# Altium footprint library CADTchip.PcbLib: 195 footprints (part 3 of 13)
Each footprint in its own frame and in the unit in brackets; x right, y up, seen from the top. Pads: shape width x height; smd on the part's side, far side on the other; paste and mask are expansions set on the pad; w line width, h text height; cw(c..) or ccw(c..) is an arc to the next point about the centre after c.
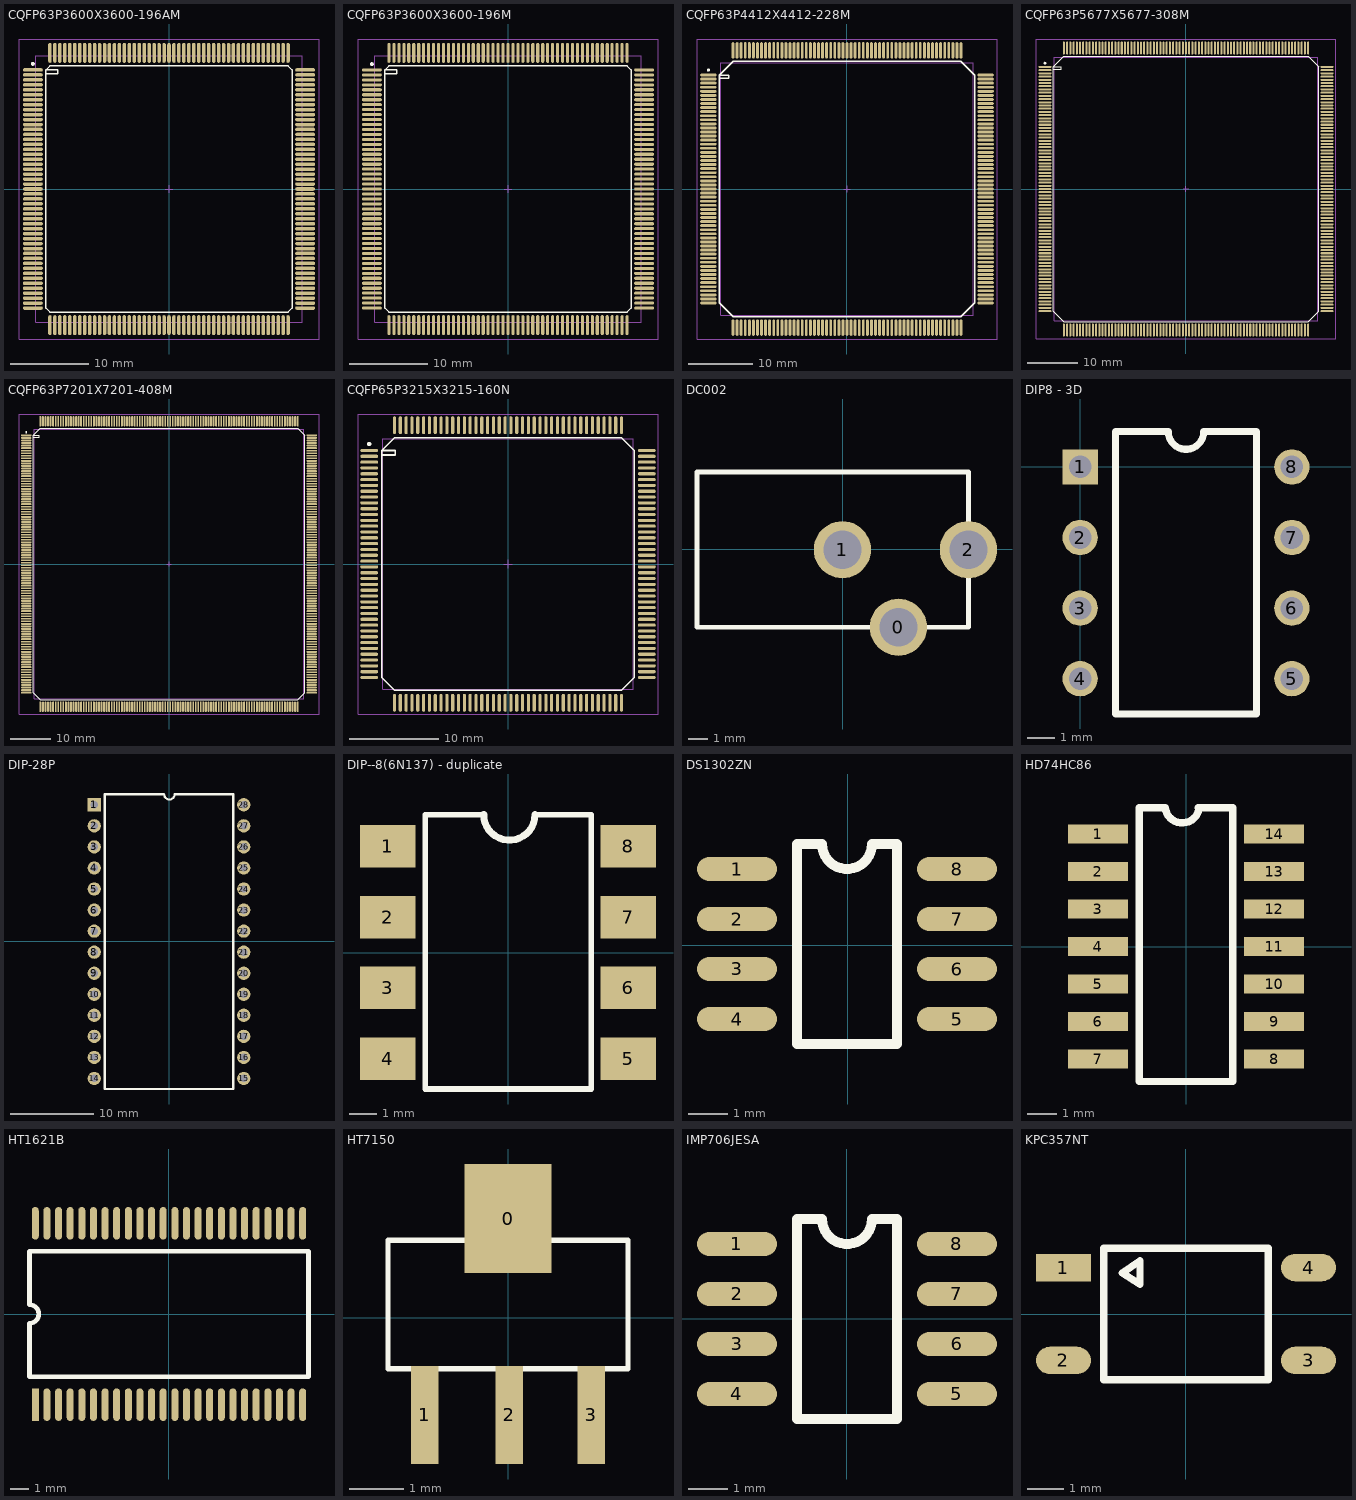
[diagram p2: the footprints below, top view; thin cyan lines are the x and y axes]

## CQFP63P3600X3600-196AM [mm] "196-Pin Ceramic Quad Flat Pack 0.635 mm Pitch"
height 2.7
pads (196):
  oval 2.55x0.45 smd: 1(-17.425,15.24) 2(-17.425,14.605) 3(-17.425,13.97) 4(-17.425,13.335) 5(-17.425,12.7) 6(-17.425,12.065) 7(-17.425,11.43) 8(-17.425,10.795) 9(-17.425,10.16) 10(-17.425,9.525) 11(-17.425,8.89) 12(-17.425,8.255) 13(-17.425,7.62) 14(-17.425,6.985) 15(-17.425,6.35) 16(-17.425,5.715) 17(-17.425,5.08) 18(-17.425,4.445) 19(-17.425,3.81) 20(-17.425,3.175) 21(-17.425,2.54) 22(-17.425,1.905) 23(-17.425,1.27) 24(-17.425,0.635) 25(-17.425,0) 26(-17.425,-0.635) 27(-17.425,-1.27) 28(-17.425,-1.905) 29(-17.425,-2.54) 30(-17.425,-3.175) 31(-17.425,-3.81) 32(-17.425,-4.445) 33(-17.425,-5.08) 34(-17.425,-5.715) 35(-17.425,-6.35) 36(-17.425,-6.985) 37(-17.425,-7.62) 38(-17.425,-8.255) 39(-17.425,-8.89) 40(-17.425,-9.525) 41(-17.425,-10.16) 42(-17.425,-10.795) 43(-17.425,-11.43) 44(-17.425,-12.065) 45(-17.425,-12.7) 46(-17.425,-13.335) 47(-17.425,-13.97) 48(-17.425,-14.605) 49(-17.425,-15.24) 99(17.425,-15.24) 100(17.425,-14.605) 101(17.425,-13.97) 102(17.425,-13.335) 103(17.425,-12.7) 104(17.425,-12.065) 105(17.425,-11.43) 106(17.425,-10.795) 107(17.425,-10.16) 108(17.425,-9.525) 109(17.425,-8.89) 110(17.425,-8.255) 111(17.425,-7.62) 112(17.425,-6.985) 113(17.425,-6.35) 114(17.425,-5.715) 115(17.425,-5.08) 116(17.425,-4.445) 117(17.425,-3.81) 118(17.425,-3.175) 119(17.425,-2.54) 120(17.425,-1.905) 121(17.425,-1.27) 122(17.425,-0.635) 123(17.425,0) 124(17.425,0.635) 125(17.425,1.27) 126(17.425,1.905) 127(17.425,2.54) 128(17.425,3.175) 129(17.425,3.81) 130(17.425,4.445) 131(17.425,5.08) 132(17.425,5.715) 133(17.425,6.35) 134(17.425,6.985) 135(17.425,7.62) 136(17.425,8.255) 137(17.425,8.89) 138(17.425,9.525) 139(17.425,10.16) 140(17.425,10.795) 141(17.425,11.43) 142(17.425,12.065) 143(17.425,12.7) 144(17.425,13.335) 145(17.425,13.97) 146(17.425,14.605) 147(17.425,15.24)
  oval 0.45x2.55 smd: 50(-15.24,-17.425) 51(-14.605,-17.425) 52(-13.97,-17.425) 53(-13.335,-17.425) 54(-12.7,-17.425) 55(-12.065,-17.425) 56(-11.43,-17.425) 57(-10.795,-17.425) 58(-10.16,-17.425) 59(-9.525,-17.425) 60(-8.89,-17.425) 61(-8.255,-17.425) 62(-7.62,-17.425) 63(-6.985,-17.425) 64(-6.35,-17.425) 65(-5.715,-17.425) 66(-5.08,-17.425) 67(-4.445,-17.425) 68(-3.81,-17.425) 69(-3.175,-17.425) 70(-2.54,-17.425) 71(-1.905,-17.425) 72(-1.27,-17.425) 73(-0.635,-17.425) 74(0,-17.425) 75(0.635,-17.425) 76(1.27,-17.425) 77(1.905,-17.425) 78(2.54,-17.425) 79(3.175,-17.425) 80(3.81,-17.425) 81(4.445,-17.425) 82(5.08,-17.425) 83(5.715,-17.425) 84(6.35,-17.425) 85(6.985,-17.425) 86(7.62,-17.425) 87(8.255,-17.425) 88(8.89,-17.425) 89(9.525,-17.425) 90(10.16,-17.425) 91(10.795,-17.425) 92(11.43,-17.425) 93(12.065,-17.425) 94(12.7,-17.425) 95(13.335,-17.425) 96(13.97,-17.425) 97(14.605,-17.425) 98(15.24,-17.425) 148(15.24,17.425) 149(14.605,17.425) 150(13.97,17.425) 151(13.335,17.425) 152(12.7,17.425) 153(12.065,17.425) 154(11.43,17.425) 155(10.795,17.425) 156(10.16,17.425) 157(9.525,17.425) 158(8.89,17.425) 159(8.255,17.425) 160(7.62,17.425) 161(6.985,17.425) 162(6.35,17.425) 163(5.715,17.425) 164(5.08,17.425) 165(4.445,17.425) 166(3.81,17.425) 167(3.175,17.425) 168(2.54,17.425) 169(1.905,17.425) 170(1.27,17.425) 171(0.635,17.425) 172(0,17.425) 173(-0.635,17.425) 174(-1.27,17.425) 175(-1.905,17.425) 176(-2.54,17.425) 177(-3.175,17.425) 178(-3.81,17.425) 179(-4.445,17.425) 180(-5.08,17.425) 181(-5.715,17.425) 182(-6.35,17.425) 183(-6.985,17.425) 184(-7.62,17.425) 185(-8.255,17.425) 186(-8.89,17.425) 187(-9.525,17.425) 188(-10.16,17.425) 189(-10.795,17.425) 190(-11.43,17.425) 191(-12.065,17.425) 192(-12.7,17.425) 193(-13.335,17.425) 194(-13.97,17.425) 195(-14.605,17.425) 196(-15.24,17.425)
Top Overlay:
  circle w0.25: c-17.425,16.015 r0.125
  lines w0.2: -15.75,14.74 -14.25,14.74 -14.25,15.24 -15.75,15.24 ; -15.75,15.24 -15.24,15.75 15.24,15.75 15.75,15.24 15.75,-15.24 15.24,-15.75 -15.24,-15.75 -15.75,-15.24 -15.75,15.24
Mechanical 13:
  lines w0.1: -17.025,-17.025 17.025,-17.025 17.025,17.025 -17.025,17.025 -17.025,-17.025
Mechanical 15:
  lines w0.1: -0.5,0 0.5,0 ; 0,-0.5 0,0.5 ; -19.2,-19.2 19.2,-19.2 19.2,19.2 -19.2,19.2 -19.2,-19.2
3D body: height 2.7, standoff 0, extent -17.025,-17.025 17.025,17.025

## CQFP63P3600X3600-196M [mm] "CQFP, 196-Leads, Body 34x34mm; Pitch 0.635mm, Gullwing Leadform, IPC Low Density"
height 2.7
pads (196):
  oval 2.55x0.4 smd: 1(-17.425,15.24) 2(-17.425,14.605) 3(-17.425,13.97) 4(-17.425,13.335) 5(-17.425,12.7) 6(-17.425,12.065) 7(-17.425,11.43) 8(-17.425,10.795) 9(-17.425,10.16) 10(-17.425,9.525) 11(-17.425,8.89) 12(-17.425,8.255) 13(-17.425,7.62) 14(-17.425,6.985) 15(-17.425,6.35) 16(-17.425,5.715) 17(-17.425,5.08) 18(-17.425,4.445) 19(-17.425,3.81) 20(-17.425,3.175) 21(-17.425,2.54) 22(-17.425,1.905) 23(-17.425,1.27) 24(-17.425,0.635) 25(-17.425,0) 26(-17.425,-0.635) 27(-17.425,-1.27) 28(-17.425,-1.905) 29(-17.425,-2.54) 30(-17.425,-3.175) 31(-17.425,-3.81) 32(-17.425,-4.445) 33(-17.425,-5.08) 34(-17.425,-5.715) 35(-17.425,-6.35) 36(-17.425,-6.985) 37(-17.425,-7.62) 38(-17.425,-8.255) 39(-17.425,-8.89) 40(-17.425,-9.525) 41(-17.425,-10.16) 42(-17.425,-10.795) 43(-17.425,-11.43) 44(-17.425,-12.065) 45(-17.425,-12.7) 46(-17.425,-13.335) 47(-17.425,-13.97) 48(-17.425,-14.605) 49(-17.425,-15.24) 99(17.425,-15.24) 100(17.425,-14.605) 101(17.425,-13.97) 102(17.425,-13.335) 103(17.425,-12.7) 104(17.425,-12.065) 105(17.425,-11.43) 106(17.425,-10.795) 107(17.425,-10.16) 108(17.425,-9.525) 109(17.425,-8.89) 110(17.425,-8.255) 111(17.425,-7.62) 112(17.425,-6.985) 113(17.425,-6.35) 114(17.425,-5.715) 115(17.425,-5.08) 116(17.425,-4.445) 117(17.425,-3.81) 118(17.425,-3.175) 119(17.425,-2.54) 120(17.425,-1.905) 121(17.425,-1.27) 122(17.425,-0.635) 123(17.425,0) 124(17.425,0.635) 125(17.425,1.27) 126(17.425,1.905) 127(17.425,2.54) 128(17.425,3.175) 129(17.425,3.81) 130(17.425,4.445) 131(17.425,5.08) 132(17.425,5.715) 133(17.425,6.35) 134(17.425,6.985) 135(17.425,7.62) 136(17.425,8.255) 137(17.425,8.89) 138(17.425,9.525) 139(17.425,10.16) 140(17.425,10.795) 141(17.425,11.43) 142(17.425,12.065) 143(17.425,12.7) 144(17.425,13.335) 145(17.425,13.97) 146(17.425,14.605) 147(17.425,15.24)
  oval 0.4x2.55 smd: 50(-15.24,-17.425) 51(-14.605,-17.425) 52(-13.97,-17.425) 53(-13.335,-17.425) 54(-12.7,-17.425) 55(-12.065,-17.425) 56(-11.43,-17.425) 57(-10.795,-17.425) 58(-10.16,-17.425) 59(-9.525,-17.425) 60(-8.89,-17.425) 61(-8.255,-17.425) 62(-7.62,-17.425) 63(-6.985,-17.425) 64(-6.35,-17.425) 65(-5.715,-17.425) 66(-5.08,-17.425) 67(-4.445,-17.425) 68(-3.81,-17.425) 69(-3.175,-17.425) 70(-2.54,-17.425) 71(-1.905,-17.425) 72(-1.27,-17.425) 73(-0.635,-17.425) 74(0,-17.425) 75(0.635,-17.425) 76(1.27,-17.425) 77(1.905,-17.425) 78(2.54,-17.425) 79(3.175,-17.425) 80(3.81,-17.425) 81(4.445,-17.425) 82(5.08,-17.425) 83(5.715,-17.425) 84(6.35,-17.425) 85(6.985,-17.425) 86(7.62,-17.425) 87(8.255,-17.425) 88(8.89,-17.425) 89(9.525,-17.425) 90(10.16,-17.425) 91(10.795,-17.425) 92(11.43,-17.425) 93(12.065,-17.425) 94(12.7,-17.425) 95(13.335,-17.425) 96(13.97,-17.425) 97(14.605,-17.425) 98(15.24,-17.425) 148(15.24,17.425) 149(14.605,17.425) 150(13.97,17.425) 151(13.335,17.425) 152(12.7,17.425) 153(12.065,17.425) 154(11.43,17.425) 155(10.795,17.425) 156(10.16,17.425) 157(9.525,17.425) 158(8.89,17.425) 159(8.255,17.425) 160(7.62,17.425) 161(6.985,17.425) 162(6.35,17.425) 163(5.715,17.425) 164(5.08,17.425) 165(4.445,17.425) 166(3.81,17.425) 167(3.175,17.425) 168(2.54,17.425) 169(1.905,17.425) 170(1.27,17.425) 171(0.635,17.425) 172(0,17.425) 173(-0.635,17.425) 174(-1.27,17.425) 175(-1.905,17.425) 176(-2.54,17.425) 177(-3.175,17.425) 178(-3.81,17.425) 179(-4.445,17.425) 180(-5.08,17.425) 181(-5.715,17.425) 182(-6.35,17.425) 183(-6.985,17.425) 184(-7.62,17.425) 185(-8.255,17.425) 186(-8.89,17.425) 187(-9.525,17.425) 188(-10.16,17.425) 189(-10.795,17.425) 190(-11.43,17.425) 191(-12.065,17.425) 192(-12.7,17.425) 193(-13.335,17.425) 194(-13.97,17.425) 195(-14.605,17.425) 196(-15.24,17.425)
Top Overlay:
  circle w0.25: c-17.425,15.99 r0.125
  lines w0.2: -15.75,14.74 -14.25,14.74 -14.25,15.24 -15.75,15.24 ; -15.75,15.24 -15.75,-15.24 -15.24,-15.75 15.24,-15.75 15.75,-15.24 15.75,15.24 15.24,15.75 -15.24,15.75 -15.75,15.24
Mechanical 13:
  lines w0.1: -17.025,-17.025 -17.025,17.025 17.025,17.025 17.025,-17.025 -17.025,-17.025
Mechanical 15:
  lines w0.1: -0.5,0 0.5,0 ; 0,-0.5 0,0.5 ; -19.2,-19.2 -19.2,19.2 19.2,19.2 19.2,-19.2 -19.2,-19.2
3D body: height 2.7, standoff 0, extent -17.025,-17.025 17.025,17.025

## CQFP63P4412X4412-228M [mm] "228-Pin Ceramic Brazed Quad Flat Pack (CB228)"
height 3.4
pads (228):
  oval 2.55x0.45 smd: 1(-21.625,17.78) 2(-21.625,17.145) 3(-21.625,16.51) 4(-21.625,15.875) 5(-21.625,15.24) 6(-21.625,14.605) 7(-21.625,13.97) 8(-21.625,13.335) 9(-21.625,12.7) 10(-21.625,12.065) 11(-21.625,11.43) 12(-21.625,10.795) 13(-21.625,10.16) 14(-21.625,9.525) 15(-21.625,8.89) 16(-21.625,8.255) 17(-21.625,7.62) 18(-21.625,6.985) 19(-21.625,6.35) 20(-21.625,5.715) 21(-21.625,5.08) 22(-21.625,4.445) 23(-21.625,3.81) 24(-21.625,3.175) 25(-21.625,2.54) 26(-21.625,1.905) 27(-21.625,1.27) 28(-21.625,0.635) 29(-21.625,0) 30(-21.625,-0.635) 31(-21.625,-1.27) 32(-21.625,-1.905) 33(-21.625,-2.54) 34(-21.625,-3.175) 35(-21.625,-3.81) 36(-21.625,-4.445) 37(-21.625,-5.08) 38(-21.625,-5.715) 39(-21.625,-6.35) 40(-21.625,-6.985) 41(-21.625,-7.62) 42(-21.625,-8.255) 43(-21.625,-8.89) 44(-21.625,-9.525) 45(-21.625,-10.16) 46(-21.625,-10.795) 47(-21.625,-11.43) 48(-21.625,-12.065) 49(-21.625,-12.7) 50(-21.625,-13.335) 51(-21.625,-13.97) 52(-21.625,-14.605) 53(-21.625,-15.24) 54(-21.625,-15.875) 55(-21.625,-16.51) 56(-21.625,-17.145) 57(-21.625,-17.78) 115(21.625,-17.78) 116(21.625,-17.145) 117(21.625,-16.51) 118(21.625,-15.875) 119(21.625,-15.24) 120(21.625,-14.605) 121(21.625,-13.97) 122(21.625,-13.335) 123(21.625,-12.7) 124(21.625,-12.065) 125(21.625,-11.43) 126(21.625,-10.795) 127(21.625,-10.16) 128(21.625,-9.525) 129(21.625,-8.89) 130(21.625,-8.255) 131(21.625,-7.62) 132(21.625,-6.985) 133(21.625,-6.35) 134(21.625,-5.715) 135(21.625,-5.08) 136(21.625,-4.445) 137(21.625,-3.81) 138(21.625,-3.175) 139(21.625,-2.54) 140(21.625,-1.905) 141(21.625,-1.27) 142(21.625,-0.635) 143(21.625,0) 144(21.625,0.635) 145(21.625,1.27) 146(21.625,1.905) 147(21.625,2.54) 148(21.625,3.175) 149(21.625,3.81) 150(21.625,4.445) 151(21.625,5.08) 152(21.625,5.715) 153(21.625,6.35) 154(21.625,6.985) 155(21.625,7.62) 156(21.625,8.255) 157(21.625,8.89) 158(21.625,9.525) 159(21.625,10.16) 160(21.625,10.795) 161(21.625,11.43) 162(21.625,12.065) 163(21.625,12.7) 164(21.625,13.335) 165(21.625,13.97) 166(21.625,14.605) 167(21.625,15.24) 168(21.625,15.875) 169(21.625,16.51) 170(21.625,17.145) 171(21.625,17.78)
  oval 0.45x2.55 smd: 58(-17.78,-21.625) 59(-17.145,-21.625) 60(-16.51,-21.625) 61(-15.875,-21.625) 62(-15.24,-21.625) 63(-14.605,-21.625) 64(-13.97,-21.625) 65(-13.335,-21.625) 66(-12.7,-21.625) 67(-12.065,-21.625) 68(-11.43,-21.625) 69(-10.795,-21.625) 70(-10.16,-21.625) 71(-9.525,-21.625) 72(-8.89,-21.625) 73(-8.255,-21.625) 74(-7.62,-21.625) 75(-6.985,-21.625) 76(-6.35,-21.625) 77(-5.715,-21.625) 78(-5.08,-21.625) 79(-4.445,-21.625) 80(-3.81,-21.625) 81(-3.175,-21.625) 82(-2.54,-21.625) 83(-1.905,-21.625) 84(-1.27,-21.625) 85(-0.635,-21.625) 86(0,-21.625) 87(0.635,-21.625) 88(1.27,-21.625) 89(1.905,-21.625) 90(2.54,-21.625) 91(3.175,-21.625) 92(3.81,-21.625) 93(4.445,-21.625) 94(5.08,-21.625) 95(5.715,-21.625) 96(6.35,-21.625) 97(6.985,-21.625) 98(7.62,-21.625) 99(8.255,-21.625) 100(8.89,-21.625) 101(9.525,-21.625) 102(10.16,-21.625) 103(10.795,-21.625) 104(11.43,-21.625) 105(12.065,-21.625) 106(12.7,-21.625) 107(13.335,-21.625) 108(13.97,-21.625) 109(14.605,-21.625) 110(15.24,-21.625) 111(15.875,-21.625) 112(16.51,-21.625) 113(17.145,-21.625) 114(17.78,-21.625) 172(17.78,21.625) 173(17.145,21.625) 174(16.51,21.625) 175(15.875,21.625) 176(15.24,21.625) 177(14.605,21.625) 178(13.97,21.625) 179(13.335,21.625) 180(12.7,21.625) 181(12.065,21.625) 182(11.43,21.625) 183(10.795,21.625) 184(10.16,21.625) 185(9.525,21.625) 186(8.89,21.625) 187(8.255,21.625) 188(7.62,21.625) 189(6.985,21.625) 190(6.35,21.625) 191(5.715,21.625) 192(5.08,21.625) 193(4.445,21.625) 194(3.81,21.625) 195(3.175,21.625) 196(2.54,21.625) 197(1.905,21.625) 198(1.27,21.625) 199(0.635,21.625) 200(0,21.625) 201(-0.635,21.625) 202(-1.27,21.625) 203(-1.905,21.625) 204(-2.54,21.625) 205(-3.175,21.625) 206(-3.81,21.625) 207(-4.445,21.625) 208(-5.08,21.625) 209(-5.715,21.625) 210(-6.35,21.625) 211(-6.985,21.625) 212(-7.62,21.625) 213(-8.255,21.625) 214(-8.89,21.625) 215(-9.525,21.625) 216(-10.16,21.625) 217(-10.795,21.625) 218(-11.43,21.625) 219(-12.065,21.625) 220(-12.7,21.625) 221(-13.335,21.625) 222(-13.97,21.625) 223(-14.605,21.625) 224(-15.24,21.625) 225(-15.875,21.625) 226(-16.51,21.625) 227(-17.145,21.625) 228(-17.78,21.625)
Top Overlay:
  circle w0.25: c-21.625,18.555 r0.125
  lines w0.2: -19.95,17.28 -18.45,17.28 -18.45,17.78 -19.95,17.78 ; -19.95,17.78 -17.78,19.95 17.78,19.95 19.95,17.78 19.95,-17.78 17.78,-19.95 -17.78,-19.95 -19.95,-17.78 -19.95,17.78
Mechanical 13:
  lines w0.1: -19.71,-19.71 19.71,-19.71 19.71,19.71 -19.71,19.71 -19.71,-19.71
Mechanical 15:
  lines w0.1: -0.5,0 0.5,0 ; 0,-0.5 0,0.5 ; -23.4,-23.4 23.4,-23.4 23.4,23.4 -23.4,23.4 -23.4,-23.4
3D body: height 3.4, standoff 0, extent -19.71,-19.71 19.71,19.71

## CQFP63P5677X5677-308M [mm] "CQFP, 308-Leads, Body 52x52mm; Pitch 0.635mm, Gullwing Leadform, IPC Low Density"
height 2.6
pads (308):
  oval 2.55x0.4 smd: 1(-27.875,24.13) 2(-27.875,23.495) 3(-27.875,22.86) 4(-27.875,22.225) 5(-27.875,21.59) 6(-27.875,20.955) 7(-27.875,20.32) 8(-27.875,19.685) 9(-27.875,19.05) 10(-27.875,18.415) 11(-27.875,17.78) 12(-27.875,17.145) 13(-27.875,16.51) 14(-27.875,15.875) 15(-27.875,15.24) 16(-27.875,14.605) 17(-27.875,13.97) 18(-27.875,13.335) 19(-27.875,12.7) 20(-27.875,12.065) 21(-27.875,11.43) 22(-27.875,10.795) 23(-27.875,10.16) 24(-27.875,9.525) 25(-27.875,8.89) 26(-27.875,8.255) 27(-27.875,7.62) 28(-27.875,6.985) 29(-27.875,6.35) 30(-27.875,5.715) 31(-27.875,5.08) 32(-27.875,4.445) 33(-27.875,3.81) 34(-27.875,3.175) 35(-27.875,2.54) 36(-27.875,1.905) 37(-27.875,1.27) 38(-27.875,0.635) 39(-27.875,0) 40(-27.875,-0.635) 41(-27.875,-1.27) 42(-27.875,-1.905) 43(-27.875,-2.54) 44(-27.875,-3.175) 45(-27.875,-3.81) 46(-27.875,-4.445) 47(-27.875,-5.08) 48(-27.875,-5.715) 49(-27.875,-6.35) 50(-27.875,-6.985) 51(-27.875,-7.62) 52(-27.875,-8.255) 53(-27.875,-8.89) 54(-27.875,-9.525) 55(-27.875,-10.16) 56(-27.875,-10.795) 57(-27.875,-11.43) 58(-27.875,-12.065) 59(-27.875,-12.7) 60(-27.875,-13.335) 61(-27.875,-13.97) 62(-27.875,-14.605) 63(-27.875,-15.24) 64(-27.875,-15.875) 65(-27.875,-16.51) 66(-27.875,-17.145) 67(-27.875,-17.78) 68(-27.875,-18.415) 69(-27.875,-19.05) 70(-27.875,-19.685) 71(-27.875,-20.32) 72(-27.875,-20.955) 73(-27.875,-21.59) 74(-27.875,-22.225) 75(-27.875,-22.86) 76(-27.875,-23.495) 77(-27.875,-24.13) 155(27.875,-24.13) 156(27.875,-23.495) 157(27.875,-22.86) 158(27.875,-22.225) 159(27.875,-21.59) 160(27.875,-20.955) 161(27.875,-20.32) 162(27.875,-19.685) 163(27.875,-19.05) 164(27.875,-18.415) 165(27.875,-17.78) 166(27.875,-17.145) 167(27.875,-16.51) 168(27.875,-15.875) 169(27.875,-15.24) 170(27.875,-14.605) 171(27.875,-13.97) 172(27.875,-13.335) 173(27.875,-12.7) 174(27.875,-12.065) 175(27.875,-11.43) 176(27.875,-10.795) 177(27.875,-10.16) 178(27.875,-9.525) 179(27.875,-8.89) 180(27.875,-8.255) 181(27.875,-7.62) 182(27.875,-6.985) 183(27.875,-6.35) 184(27.875,-5.715) 185(27.875,-5.08) 186(27.875,-4.445) 187(27.875,-3.81) 188(27.875,-3.175) 189(27.875,-2.54) 190(27.875,-1.905) 191(27.875,-1.27) 192(27.875,-0.635) 193(27.875,0) 194(27.875,0.635) 195(27.875,1.27) 196(27.875,1.905) 197(27.875,2.54) 198(27.875,3.175) 199(27.875,3.81) 200(27.875,4.445) 201(27.875,5.08) 202(27.875,5.715) 203(27.875,6.35) 204(27.875,6.985) 205(27.875,7.62) 206(27.875,8.255) 207(27.875,8.89) 208(27.875,9.525) 209(27.875,10.16) 210(27.875,10.795) 211(27.875,11.43) 212(27.875,12.065) 213(27.875,12.7) 214(27.875,13.335) 215(27.875,13.97) 216(27.875,14.605) 217(27.875,15.24) 218(27.875,15.875) 219(27.875,16.51) 220(27.875,17.145) 221(27.875,17.78) 222(27.875,18.415) 223(27.875,19.05) 224(27.875,19.685) 225(27.875,20.32) 226(27.875,20.955) 227(27.875,21.59) 228(27.875,22.225) 229(27.875,22.86) 230(27.875,23.495) 231(27.875,24.13)
  oval 0.4x2.55 smd: 78(-24.13,-27.875) 79(-23.495,-27.875) 80(-22.86,-27.875) 81(-22.225,-27.875) 82(-21.59,-27.875) 83(-20.955,-27.875) 84(-20.32,-27.875) 85(-19.685,-27.875) 86(-19.05,-27.875) 87(-18.415,-27.875) 88(-17.78,-27.875) 89(-17.145,-27.875) 90(-16.51,-27.875) 91(-15.875,-27.875) 92(-15.24,-27.875) 93(-14.605,-27.875) 94(-13.97,-27.875) 95(-13.335,-27.875) 96(-12.7,-27.875) 97(-12.065,-27.875) 98(-11.43,-27.875) 99(-10.795,-27.875) 100(-10.16,-27.875) 101(-9.525,-27.875) 102(-8.89,-27.875) 103(-8.255,-27.875) 104(-7.62,-27.875) 105(-6.985,-27.875) 106(-6.35,-27.875) 107(-5.715,-27.875) 108(-5.08,-27.875) 109(-4.445,-27.875) 110(-3.81,-27.875) 111(-3.175,-27.875) 112(-2.54,-27.875) 113(-1.905,-27.875) 114(-1.27,-27.875) 115(-0.635,-27.875) 116(0,-27.875) 117(0.635,-27.875) 118(1.27,-27.875) 119(1.905,-27.875) 120(2.54,-27.875) 121(3.175,-27.875) 122(3.81,-27.875) 123(4.445,-27.875) 124(5.08,-27.875) 125(5.715,-27.875) 126(6.35,-27.875) 127(6.985,-27.875) 128(7.62,-27.875) 129(8.255,-27.875) 130(8.89,-27.875) 131(9.525,-27.875) 132(10.16,-27.875) 133(10.795,-27.875) 134(11.43,-27.875) 135(12.065,-27.875) 136(12.7,-27.875) 137(13.335,-27.875) 138(13.97,-27.875) 139(14.605,-27.875) 140(15.24,-27.875) 141(15.875,-27.875) 142(16.51,-27.875) 143(17.145,-27.875) 144(17.78,-27.875) 145(18.415,-27.875) 146(19.05,-27.875) 147(19.685,-27.875) 148(20.32,-27.875) 149(20.955,-27.875) 150(21.59,-27.875) 151(22.225,-27.875) 152(22.86,-27.875) 153(23.495,-27.875) 154(24.13,-27.875) 232(24.13,27.875) 233(23.495,27.875) 234(22.86,27.875) 235(22.225,27.875) 236(21.59,27.875) 237(20.955,27.875) 238(20.32,27.875) 239(19.685,27.875) 240(19.05,27.875) 241(18.415,27.875) 242(17.78,27.875) 243(17.145,27.875) 244(16.51,27.875) 245(15.875,27.875) 246(15.24,27.875) 247(14.605,27.875) 248(13.97,27.875) 249(13.335,27.875) 250(12.7,27.875) 251(12.065,27.875) 252(11.43,27.875) 253(10.795,27.875) 254(10.16,27.875) 255(9.525,27.875) 256(8.89,27.875) 257(8.255,27.875) 258(7.62,27.875) 259(6.985,27.875) 260(6.35,27.875) 261(5.715,27.875) 262(5.08,27.875) 263(4.445,27.875) 264(3.81,27.875) 265(3.175,27.875) 266(2.54,27.875) 267(1.905,27.875) 268(1.27,27.875) 269(0.635,27.875) 270(0,27.875) 271(-0.635,27.875) 272(-1.27,27.875) 273(-1.905,27.875) 274(-2.54,27.875) 275(-3.175,27.875) 276(-3.81,27.875) 277(-4.445,27.875) 278(-5.08,27.875) 279(-5.715,27.875) 280(-6.35,27.875) 281(-6.985,27.875) 282(-7.62,27.875) 283(-8.255,27.875) 284(-8.89,27.875) 285(-9.525,27.875) 286(-10.16,27.875) 287(-10.795,27.875) 288(-11.43,27.875) 289(-12.065,27.875) 290(-12.7,27.875) 291(-13.335,27.875) 292(-13.97,27.875) 293(-14.605,27.875) 294(-15.24,27.875) 295(-15.875,27.875) 296(-16.51,27.875) 297(-17.145,27.875) 298(-17.78,27.875) 299(-18.415,27.875) 300(-19.05,27.875) 301(-19.685,27.875) 302(-20.32,27.875) 303(-20.955,27.875) 304(-21.59,27.875) 305(-22.225,27.875) 306(-22.86,27.875) 307(-23.495,27.875) 308(-24.13,27.875)
Top Overlay:
  circle w0.25: c-27.875,24.88 r0.125
  lines w0.2: -26.2,23.63 -24.7,23.63 -24.7,24.13 -26.2,24.13 ; -26.2,24.13 -26.2,-24.13 -24.13,-26.2 24.13,-26.2 26.2,-24.13 26.2,24.13 24.13,26.2 -24.13,26.2 -26.2,24.13
Mechanical 13:
  lines w0.1: -26.035,-26.035 -26.035,26.035 26.035,26.035 26.035,-26.035 -26.035,-26.035
Mechanical 15:
  lines w0.1: -0.5,0 0.5,0 ; 0,-0.5 0,0.5 ; -29.65,-29.65 -29.65,29.65 29.65,29.65 29.65,-29.65 -29.65,-29.65
3D body: height 2.6, standoff 0, extent -26.035,-26.035 26.035,26.035

## CQFP63P7201X7201-408M [mm] "408-Pin Ceramic Quad Flat Pack 0.635 mm Pitch"
height 2.5
pads (408):
  oval 2.6x0.45 smd: 1(-35.6,32.067) 2(-35.6,31.432) 3(-35.6,30.797) 4(-35.6,30.162) 5(-35.6,29.527) 6(-35.6,28.892) 7(-35.6,28.258) 8(-35.6,27.622) 9(-35.6,26.987) 10(-35.6,26.352) 11(-35.6,25.717) 12(-35.6,25.082) 13(-35.6,24.447) 14(-35.6,23.812) 15(-35.6,23.177) 16(-35.6,22.543) 17(-35.6,21.907) 18(-35.6,21.273) 19(-35.6,20.637) 20(-35.6,20.002) 21(-35.6,19.367) 22(-35.6,18.732) 23(-35.6,18.098) 24(-35.6,17.462) 25(-35.6,16.828) 26(-35.6,16.192) 27(-35.6,15.557) 28(-35.6,14.922) 29(-35.6,14.287) 30(-35.6,13.652) 31(-35.6,13.018) 32(-35.6,12.383) 33(-35.6,11.747) 34(-35.6,11.112) 35(-35.6,10.477) 36(-35.6,9.842) 37(-35.6,9.207) 38(-35.6,8.572) 39(-35.6,7.938) 40(-35.6,7.302) 41(-35.6,6.667) 42(-35.6,6.032) 43(-35.6,5.397) 44(-35.6,4.763) 45(-35.6,4.127) 46(-35.6,3.492) 47(-35.6,2.857) 48(-35.6,2.222) 49(-35.6,1.587) 50(-35.6,0.953) 51(-35.6,0.318) 52(-35.6,-0.318) 53(-35.6,-0.953) 54(-35.6,-1.587) 55(-35.6,-2.222) 56(-35.6,-2.857) 57(-35.6,-3.492) 58(-35.6,-4.127) 59(-35.6,-4.763) 60(-35.6,-5.397) 61(-35.6,-6.032) 62(-35.6,-6.667) 63(-35.6,-7.302) 64(-35.6,-7.938) 65(-35.6,-8.572) 66(-35.6,-9.207) 67(-35.6,-9.842) 68(-35.6,-10.477) 69(-35.6,-11.112) 70(-35.6,-11.747) 71(-35.6,-12.383) 72(-35.6,-13.018) 73(-35.6,-13.652) 74(-35.6,-14.287) 75(-35.6,-14.922) 76(-35.6,-15.557) 77(-35.6,-16.192) 78(-35.6,-16.828) 79(-35.6,-17.462) 80(-35.6,-18.098) 81(-35.6,-18.732) 82(-35.6,-19.367) 83(-35.6,-20.002) 84(-35.6,-20.637) 85(-35.6,-21.273) 86(-35.6,-21.907) 87(-35.6,-22.543) 88(-35.6,-23.177) 89(-35.6,-23.812) 90(-35.6,-24.447) 91(-35.6,-25.082) 92(-35.6,-25.717) 93(-35.6,-26.352) 94(-35.6,-26.987) 95(-35.6,-27.622) 96(-35.6,-28.258) 97(-35.6,-28.892) 98(-35.6,-29.527) 99(-35.6,-30.162) 100(-35.6,-30.797) 101(-35.6,-31.432) 102(-35.6,-32.067) 205(35.6,-32.067) 206(35.6,-31.432) 207(35.6,-30.797) 208(35.6,-30.162) 209(35.6,-29.527) 210(35.6,-28.892) 211(35.6,-28.258) 212(35.6,-27.622) 213(35.6,-26.987) 214(35.6,-26.352) 215(35.6,-25.717) 216(35.6,-25.082) 217(35.6,-24.447) 218(35.6,-23.812) 219(35.6,-23.177) 220(35.6,-22.543) 221(35.6,-21.907) 222(35.6,-21.273) 223(35.6,-20.637) 224(35.6,-20.002) 225(35.6,-19.367) 226(35.6,-18.732) 227(35.6,-18.098) 228(35.6,-17.462) 229(35.6,-16.828) 230(35.6,-16.192) 231(35.6,-15.557) 232(35.6,-14.922) 233(35.6,-14.287) 234(35.6,-13.652) 235(35.6,-13.018) 236(35.6,-12.383) 237(35.6,-11.747) 238(35.6,-11.112) 239(35.6,-10.477) 240(35.6,-9.842) 241(35.6,-9.207) 242(35.6,-8.572) 243(35.6,-7.938) 244(35.6,-7.302) 245(35.6,-6.667) 246(35.6,-6.032) 247(35.6,-5.397) 248(35.6,-4.763) 249(35.6,-4.127) 250(35.6,-3.492) 251(35.6,-2.857) 252(35.6,-2.222) 253(35.6,-1.587) 254(35.6,-0.953) 255(35.6,-0.318) 256(35.6,0.318) 257(35.6,0.953) 258(35.6,1.587) 259(35.6,2.222) 260(35.6,2.857) 261(35.6,3.492) 262(35.6,4.127) 263(35.6,4.763) 264(35.6,5.397) 265(35.6,6.032) 266(35.6,6.667) 267(35.6,7.302) 268(35.6,7.938) 269(35.6,8.572) 270(35.6,9.207) 271(35.6,9.842) 272(35.6,10.477) 273(35.6,11.112) 274(35.6,11.747) 275(35.6,12.383) 276(35.6,13.018) 277(35.6,13.652) 278(35.6,14.287) 279(35.6,14.922) 280(35.6,15.557) 281(35.6,16.192) 282(35.6,16.828) 283(35.6,17.462) 284(35.6,18.098) 285(35.6,18.732) 286(35.6,19.367) 287(35.6,20.002) 288(35.6,20.637) 289(35.6,21.273) 290(35.6,21.907) 291(35.6,22.543) 292(35.6,23.177) 293(35.6,23.812) 294(35.6,24.447) 295(35.6,25.082) 296(35.6,25.717) 297(35.6,26.352) 298(35.6,26.987) 299(35.6,27.622) 300(35.6,28.258) 301(35.6,28.892) 302(35.6,29.527) 303(35.6,30.162) 304(35.6,30.797) 305(35.6,31.432) 306(35.6,32.067)
  oval 0.45x2.6 smd: 103(-32.067,-35.6) 104(-31.432,-35.6) 105(-30.797,-35.6) 106(-30.162,-35.6) 107(-29.527,-35.6) 108(-28.892,-35.6) 109(-28.258,-35.6) 110(-27.622,-35.6) 111(-26.987,-35.6) 112(-26.352,-35.6) 113(-25.717,-35.6) 114(-25.082,-35.6) 115(-24.447,-35.6) 116(-23.812,-35.6) 117(-23.177,-35.6) 118(-22.543,-35.6) 119(-21.907,-35.6) 120(-21.273,-35.6) 121(-20.637,-35.6) 122(-20.002,-35.6) 123(-19.367,-35.6) 124(-18.732,-35.6) 125(-18.098,-35.6) 126(-17.462,-35.6) 127(-16.828,-35.6) 128(-16.192,-35.6) 129(-15.557,-35.6) 130(-14.922,-35.6) 131(-14.287,-35.6) 132(-13.652,-35.6) 133(-13.018,-35.6) 134(-12.383,-35.6) 135(-11.747,-35.6) 136(-11.112,-35.6) 137(-10.477,-35.6) 138(-9.842,-35.6) 139(-9.207,-35.6) 140(-8.572,-35.6) 141(-7.938,-35.6) 142(-7.302,-35.6) 143(-6.667,-35.6) 144(-6.032,-35.6) 145(-5.397,-35.6) 146(-4.763,-35.6) 147(-4.127,-35.6) 148(-3.492,-35.6) 149(-2.857,-35.6) 150(-2.222,-35.6) 151(-1.587,-35.6) 152(-0.953,-35.6) 153(-0.318,-35.6) 154(0.318,-35.6) 155(0.953,-35.6) 156(1.587,-35.6) 157(2.222,-35.6) 158(2.857,-35.6) 159(3.492,-35.6) 160(4.127,-35.6) 161(4.763,-35.6) 162(5.397,-35.6) 163(6.032,-35.6) 164(6.667,-35.6) 165(7.302,-35.6) 166(7.938,-35.6) 167(8.572,-35.6) 168(9.207,-35.6) 169(9.842,-35.6) 170(10.477,-35.6) 171(11.112,-35.6) 172(11.747,-35.6) 173(12.383,-35.6) 174(13.018,-35.6) 175(13.652,-35.6) 176(14.287,-35.6) 177(14.922,-35.6) 178(15.557,-35.6) 179(16.192,-35.6) 180(16.828,-35.6) 181(17.462,-35.6) 182(18.098,-35.6) 183(18.732,-35.6) 184(19.367,-35.6) 185(20.002,-35.6) 186(20.637,-35.6) 187(21.273,-35.6) 188(21.907,-35.6) 189(22.543,-35.6) 190(23.177,-35.6) 191(23.812,-35.6) 192(24.447,-35.6) 193(25.082,-35.6) 194(25.717,-35.6) 195(26.352,-35.6) 196(26.987,-35.6) 197(27.622,-35.6) 198(28.258,-35.6) 199(28.892,-35.6) 200(29.527,-35.6) 201(30.162,-35.6) 202(30.797,-35.6) 203(31.432,-35.6) 204(32.067,-35.6) 307(32.067,35.6) 308(31.432,35.6) 309(30.797,35.6) 310(30.162,35.6) 311(29.527,35.6) 312(28.892,35.6) 313(28.258,35.6) 314(27.622,35.6) 315(26.987,35.6) 316(26.352,35.6) 317(25.717,35.6) 318(25.082,35.6) 319(24.447,35.6) 320(23.812,35.6) 321(23.177,35.6) 322(22.543,35.6) 323(21.907,35.6) 324(21.273,35.6) 325(20.637,35.6) 326(20.002,35.6) 327(19.367,35.6) 328(18.732,35.6) 329(18.098,35.6) 330(17.462,35.6) 331(16.828,35.6) 332(16.192,35.6) 333(15.557,35.6) 334(14.922,35.6) 335(14.287,35.6) 336(13.652,35.6) 337(13.018,35.6) 338(12.383,35.6) 339(11.747,35.6) 340(11.112,35.6) 341(10.477,35.6) 342(9.842,35.6) 343(9.207,35.6) 344(8.572,35.6) 345(7.938,35.6) 346(7.302,35.6) 347(6.667,35.6) 348(6.032,35.6) 349(5.397,35.6) 350(4.763,35.6) 351(4.127,35.6) 352(3.492,35.6) 353(2.857,35.6) 354(2.222,35.6) 355(1.587,35.6) 356(0.953,35.6) 357(0.318,35.6) 358(-0.318,35.6) 359(-0.953,35.6) 360(-1.587,35.6) 361(-2.222,35.6) 362(-2.857,35.6) 363(-3.492,35.6) 364(-4.127,35.6) 365(-4.763,35.6) 366(-5.397,35.6) 367(-6.032,35.6) 368(-6.667,35.6) 369(-7.302,35.6) 370(-7.938,35.6) 371(-8.572,35.6) 372(-9.207,35.6) 373(-9.842,35.6) 374(-10.477,35.6) 375(-11.112,35.6) 376(-11.747,35.6) 377(-12.383,35.6) 378(-13.018,35.6) 379(-13.652,35.6) 380(-14.287,35.6) 381(-14.922,35.6) 382(-15.557,35.6) 383(-16.192,35.6) 384(-16.828,35.6) 385(-17.462,35.6) 386(-18.098,35.6) 387(-18.732,35.6) 388(-19.367,35.6) 389(-20.002,35.6) 390(-20.637,35.6) 391(-21.273,35.6) 392(-21.907,35.6) 393(-22.543,35.6) 394(-23.177,35.6) 395(-23.812,35.6) 396(-24.447,35.6) 397(-25.082,35.6) 398(-25.717,35.6) 399(-26.352,35.6) 400(-26.987,35.6) 401(-27.622,35.6) 402(-28.258,35.6) 403(-28.892,35.6) 404(-29.527,35.6) 405(-30.162,35.6) 406(-30.797,35.6) 407(-31.432,35.6) 408(-32.067,35.6)
Top Overlay:
  circle w0.25: c-35.6,32.842 r0.125
  lines w0.2: -33.9,31.57 -32.4,31.57 -32.4,32.07 -33.9,32.07 ; -33.9,32.07 -33.9,-32.07 -32.07,-33.9 32.07,-33.9 33.9,-32.07 33.9,32.07 32.07,33.9 -32.07,33.9 -33.9,32.07
Mechanical 13:
  lines w0.1: -33.655,-33.655 -33.655,33.655 33.655,33.655 33.655,-33.655 -33.655,-33.655
Mechanical 15:
  lines w0.1: -0.5,0 0.5,0 ; 0,-0.5 0,0.5 ; -37.4,-37.4 -37.4,37.4 37.4,37.4 37.4,-37.4 -37.4,-37.4
3D body: height 2.5, standoff 0, extent -33.655,-33.655 33.655,33.655

## CQFP65P3215X3215-160N [mm] "CQFP, 160-Leads, Body 28x28mm; Pitch 0.65mm, Gullwing Leadform, IPC Medium Density"
height 3.4
pads (160):
  oval 2x0.35 smd: 1(-15.5,12.675) 2(-15.5,12.025) 3(-15.5,11.375) 4(-15.5,10.725) 5(-15.5,10.075) 6(-15.5,9.425) 7(-15.5,8.775) 8(-15.5,8.125) 9(-15.5,7.475) 10(-15.5,6.825) 11(-15.5,6.175) 12(-15.5,5.525) 13(-15.5,4.875) 14(-15.5,4.225) 15(-15.5,3.575) 16(-15.5,2.925) 17(-15.5,2.275) 18(-15.5,1.625) 19(-15.5,0.975) 20(-15.5,0.325) 21(-15.5,-0.325) 22(-15.5,-0.975) 23(-15.5,-1.625) 24(-15.5,-2.275) 25(-15.5,-2.925) 26(-15.5,-3.575) 27(-15.5,-4.225) 28(-15.5,-4.875) 29(-15.5,-5.525) 30(-15.5,-6.175) 31(-15.5,-6.825) 32(-15.5,-7.475) 33(-15.5,-8.125) 34(-15.5,-8.775) 35(-15.5,-9.425) 36(-15.5,-10.075) 37(-15.5,-10.725) 38(-15.5,-11.375) 39(-15.5,-12.025) 40(-15.5,-12.675) 81(15.5,-12.675) 82(15.5,-12.025) 83(15.5,-11.375) 84(15.5,-10.725) 85(15.5,-10.075) 86(15.5,-9.425) 87(15.5,-8.775) 88(15.5,-8.125) 89(15.5,-7.475) 90(15.5,-6.825) 91(15.5,-6.175) 92(15.5,-5.525) 93(15.5,-4.875) 94(15.5,-4.225) 95(15.5,-3.575) 96(15.5,-2.925) 97(15.5,-2.275) 98(15.5,-1.625) 99(15.5,-0.975) 100(15.5,-0.325) 101(15.5,0.325) 102(15.5,0.975) 103(15.5,1.625) 104(15.5,2.275) 105(15.5,2.925) 106(15.5,3.575) 107(15.5,4.225) 108(15.5,4.875) 109(15.5,5.525) 110(15.5,6.175) 111(15.5,6.825) 112(15.5,7.475) 113(15.5,8.125) 114(15.5,8.775) 115(15.5,9.425) 116(15.5,10.075) 117(15.5,10.725) 118(15.5,11.375) 119(15.5,12.025) 120(15.5,12.675)
  oval 0.35x2 smd: 41(-12.675,-15.5) 42(-12.025,-15.5) 43(-11.375,-15.5) 44(-10.725,-15.5) 45(-10.075,-15.5) 46(-9.425,-15.5) 47(-8.775,-15.5) 48(-8.125,-15.5) 49(-7.475,-15.5) 50(-6.825,-15.5) 51(-6.175,-15.5) 52(-5.525,-15.5) 53(-4.875,-15.5) 54(-4.225,-15.5) 55(-3.575,-15.5) 56(-2.925,-15.5) 57(-2.275,-15.5) 58(-1.625,-15.5) 59(-0.975,-15.5) 60(-0.325,-15.5) 61(0.325,-15.5) 62(0.975,-15.5) 63(1.625,-15.5) 64(2.275,-15.5) 65(2.925,-15.5) 66(3.575,-15.5) 67(4.225,-15.5) 68(4.875,-15.5) 69(5.525,-15.5) 70(6.175,-15.5) 71(6.825,-15.5) 72(7.475,-15.5) 73(8.125,-15.5) 74(8.775,-15.5) 75(9.425,-15.5) 76(10.075,-15.5) 77(10.725,-15.5) 78(11.375,-15.5) 79(12.025,-15.5) 80(12.675,-15.5) 121(12.675,15.5) 122(12.025,15.5) 123(11.375,15.5) 124(10.725,15.5) 125(10.075,15.5) 126(9.425,15.5) 127(8.775,15.5) 128(8.125,15.5) 129(7.475,15.5) 130(6.825,15.5) 131(6.175,15.5) 132(5.525,15.5) 133(4.875,15.5) 134(4.225,15.5) 135(3.575,15.5) 136(2.925,15.5) 137(2.275,15.5) 138(1.625,15.5) 139(0.975,15.5) 140(0.325,15.5) 141(-0.325,15.5) 142(-0.975,15.5) 143(-1.625,15.5) 144(-2.275,15.5) 145(-2.925,15.5) 146(-3.575,15.5) 147(-4.225,15.5) 148(-4.875,15.5) 149(-5.525,15.5) 150(-6.175,15.5) 151(-6.825,15.5) 152(-7.475,15.5) 153(-8.125,15.5) 154(-8.775,15.5) 155(-9.425,15.5) 156(-10.075,15.5) 157(-10.725,15.5) 158(-11.375,15.5) 159(-12.025,15.5) 160(-12.675,15.5)
Top Overlay:
  circle w0.25: c-15.5,13.4 r0.125
  lines w0.2: -14.1,12.175 -12.6,12.175 -12.6,12.675 -14.1,12.675 ; -14.1,12.675 -14.1,-12.675 -12.675,-14.1 12.675,-14.1 14.1,-12.675 14.1,12.675 12.675,14.1 -12.675,14.1 -14.1,12.675
Mechanical 13:
  lines w0.1: -14,-14 -14,14 14,14 14,-14 -14,-14
Mechanical 15:
  lines w0.1: -0.5,0 0.5,0 ; 0,-0.5 0,0.5 ; -16.75,-16.75 -16.75,16.75 16.75,16.75 16.75,-16.75 -16.75,-16.75
3D body: height 3.4, standoff 0, extent -14,-14 14,14

## DC002 [mm]
pads (3):
  round 3 hole 2: 0(2.911,-4.089) 1(-0.025,-0.025) 2(6.579,-0.025)
Top Overlay:
  lines w0.254: -7.645,-4.089 -7.645,4.039 6.579,4.039 6.579,-4.089 -7.645,-4.089
3D body: height 4.5, standoff -10, extent -7.657,-4.803 6.743,4.597

## DIP8 - 3D [mil]
pads (8):
  rect 50x50 hole 32: 1(0,0)
  round 50 hole 32: 2(0,-100) 3(0,-200) 4(0,-300) 5(300,-300) 6(300,-200) 7(300,-100) 8(300,0)
Top Overlay:
  lines w10: 50,-350 250,-350 250,50 175,50 cw(c150,50) 125,50 50,50 50,-350
3D body: height 188.19, standoff -109.84, extent -4.84,-363.92 305,66

## DIP-28P [mm]
pads (28):
  rect 1.6x1.6 hole 0.9: 1(-9.042,16.434)
  round 1.6 hole 0.9: 2(-9.042,13.894) 3(-9.042,11.354) 4(-9.042,8.814) 5(-9.042,6.274) 6(-9.042,3.734) 7(-9.042,1.194) 8(-9.042,-1.346) 9(-9.042,-3.886) 10(-9.042,-6.426) 11(-9.042,-8.966) 12(-9.042,-11.506) 13(-9.042,-14.046) 14(-9.042,-16.586) 15(8.992,-16.586) 16(8.992,-14.046) 17(8.992,-11.506) 18(8.992,-8.966) 19(8.992,-6.426) 20(8.992,-3.886) 21(8.992,-1.346) 22(8.992,1.194) 23(8.992,3.734) 24(8.992,6.274) 25(8.992,8.814) 26(8.992,11.354) 27(8.992,13.894) 28(8.992,16.434)
Top Overlay:
  lines w0.254: -7.772,-17.856 -7.772,17.704 -0.61,17.704 ccw(c0.025,17.704) 0.66,17.704 7.722,17.704 7.722,-17.856 -7.772,-17.856
3D body: height 4.5, standoff 0, extent -7.73,-18.202 7.12,17.998

## DIP--8(6N137) - duplicate [mil]
pads (8):
  rect 78.74x60 smd: 1(-170,150) 2(-170,50) 3(-170,-50) 4(-170,-150) 5(170,-150) 6(170,-50) 7(170,50) 8(170,150)
Top Overlay:
  lines w7.87: -34.25,195 -117,195 -117,-193 118,-193 118,195 ; 38.25,195 117,195
  lines w10: -34.25,195 ccw(c2,195) 38.25,195
3D body: height 182.15, standoff 3.85, extent -195.84,-187.96 193.93,190

## DS1302ZN [mil] "SO-8"
pads (8):
  oval 80x24 smd: 1(-110.94,76.48) 2(-110.94,26.48) 3(-110.94,-23.52) 4(-110.94,-73.52) 5(109.06,-73.52) 6(109.06,-23.52) 7(109.06,26.48) 8(109.06,76.48)
Top Overlay:
  lines w10: -50.94,-98.52 49.06,-98.52 49.06,101.48 24.06,101.48 cw(c-0.94,101.48) -25.94,101.48 -50.94,101.48 -50.94,-98.52

## HD74HC86 [mm]
pads (14):
  rect 2.03x0.65 smd: 1(-2.984,3.81) 2(-2.984,2.54) 3(-2.984,1.27) 4(-2.984,0) 5(-2.984,-1.27) 6(-2.984,-2.54) 7(-2.984,-3.81) 8(2.984,-3.81) 9(2.984,-2.54) 10(2.984,-1.27) 11(2.984,0) 12(2.984,1.27) 13(2.984,2.54) 14(2.984,3.81)
Top Overlay:
  lines w0.25: -0.698,4.699 -1.587,4.699 -1.587,-4.572 1.587,-4.572 1.587,4.699 0.419,4.699
  lines w0.254: -0.698,4.699 ccw(c-0.127,4.763) 0.419,4.581

## HT1621B [mil]
pads (48):
  rect 15x70 smd: 1(-287.5,-195)
  oval 15x70 smd: 2(-262.5,-195) 3(-237.5,-195) 4(-212.5,-195) 5(-187.5,-195) 6(-162.5,-195) 7(-137.5,-195) 8(-112.5,-195) 9(-87.5,-195) 10(-62.5,-195) 11(-37.5,-195) 12(-12.5,-195) 13(12.5,-195) 14(37.5,-195) 15(62.5,-195) 16(87.5,-195) 17(112.5,-195) 18(137.5,-195) 19(162.5,-195) 20(187.5,-195) 21(212.5,-195) 22(237.5,-195) 23(262.5,-195) 24(287.5,-195) 25(287.5,195) 26(262.5,195) 27(237.5,195) 28(212.5,195) 29(187.5,195) 30(162.5,195) 31(137.5,195) 32(112.5,195) 33(87.5,195) 34(62.5,195) 35(37.5,195) 36(12.5,195) 37(-12.5,195) 38(-37.5,195) 39(-62.5,195) 40(-87.5,195) 41(-112.5,195) 42(-137.5,195) 43(-162.5,195) 44(-187.5,195) 45(-212.5,195) 46(-237.5,195) 47(-262.5,195) 48(-287.5,195)
Top Overlay:
  lines w10: -300,-135 300,-135 300,135 -300,135 -300,20 cw(c-300,0) -300,-20 -300,-135

## HT7150 [mm] "MYSOT89"
pads (4):
  rect 1.6x2 smd: 0(-0.001,1.822)
  rect 0.5x1.8 smd: 1(-1.525,-1.778) 2(0.024,-1.778) 3(1.523,-1.778)
Top Overlay:
  lines w0.1: -2.201,-0.928 -2.201,1.422 2.199,1.422 2.199,-0.928 -2.201,-0.928

## IMP706JESA [mil]
pads (8):
  oval 80x24 smd: 1(-110,75) 2(-110,25) 3(-110,-25) 4(-110,-75) 5(110,-75) 6(110,-25) 7(110,25) 8(110,75)
Top Overlay:
  lines w10: -50,-100 50,-100 50,100 25,100 cw(c0,100) -25,100 -50,100 -50,-100

## KPC357NT [mm]
pads (4):
  rect 1.5x0.75 smd: 1(-3.35,1.27)
  oval 1.5x0.75 smd: 2(-3.35,-1.27) 3(3.35,-1.27) 4(3.35,1.27)
Top Overlay:
  lines w0.2: -2.25,-1.8 -2.25,1.8 2.25,1.8 2.25,-1.8 -2.25,-1.8 ; -1.742,1.121 -1.259,1.451 -1.259,0.816 -1.742,1.121